# Altium footprint library PCB_PASSIVE.PcbLib: 100 footprints (part 5 of 7)
Each footprint in its own frame and in the unit in brackets; x right, y up, seen from the top. Pads: shape width x height; smd on the part's side, far side on the other; paste and mask are expansions set on the pad; w line width, h text height; cw(c..) or ccw(c..) is an arc to the next point about the centre after c.
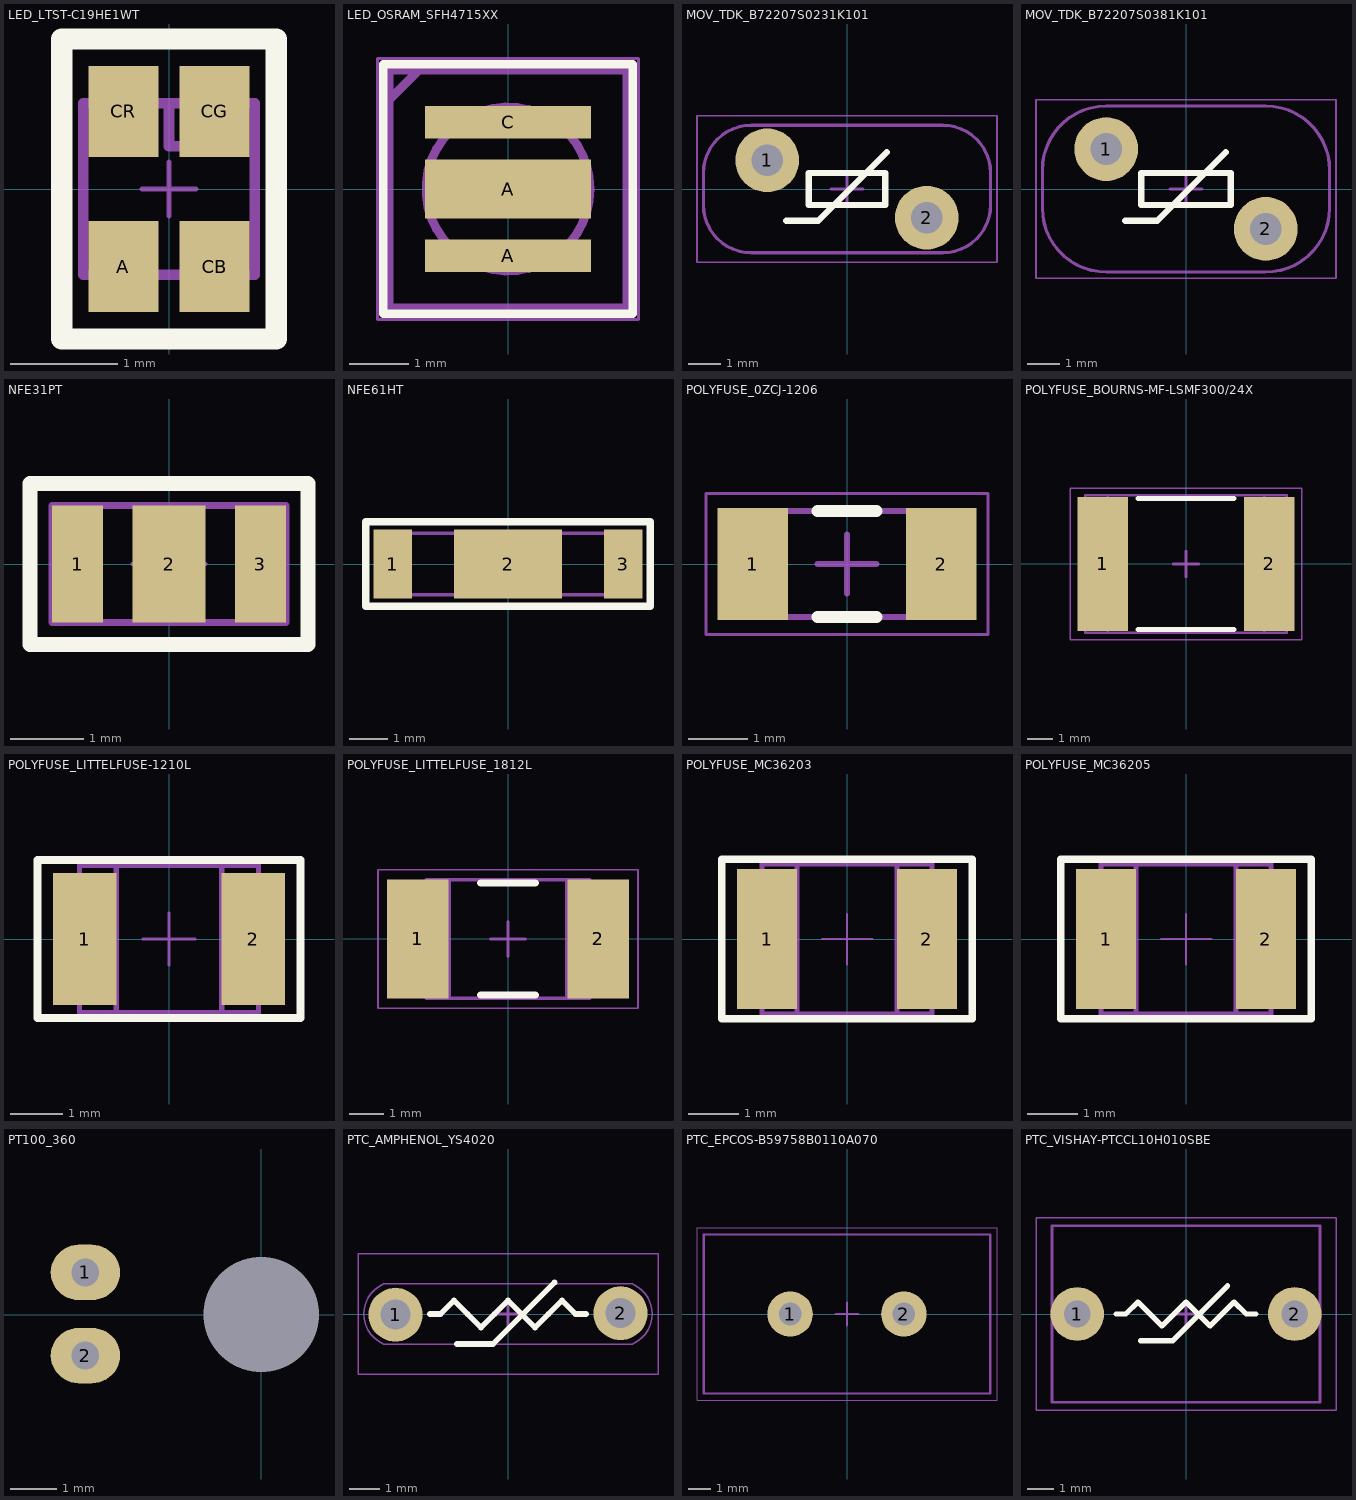
[diagram p4: the footprints below, top view; thin cyan lines are the x and y axes]

## LED_LTST-C19HE1WT [mm]
height 0.35
pads (4):
  rect 0.65x0.85 smd: A(-0.425,-0.725) CB(0.425,-0.725) CG(0.425,0.725) CR(-0.425,0.725)
Top Overlay:
  lines w0.2: -1,-1.4 -1,0 -1,1.4 1,1.4 1,-1.4 -1,-1.4
Mechanical 11:
  text ".Designator" at -1.4,-0.4 h1
Mechanical 14:
  lines w0.1: 0.4,0.8 0.4,0.4 0,0.4 0,0.8 ; 0,0.8 0.8,0.8 0.8,0 0.8,-0.8 0,-0.8 -0.8,-0.8 -0.8,0 -0.8,0.8 0,0.8
Mechanical 15:
  lines w0.05: -0.25,0 0.25,0 ; 0,-0.25 0,0.25 ; -1,-1.4 -1,0 -1,1.4 1,1.4 1,-1.4 -1,-1.4
3D body "User Library-HSMF-C114.STEP": height 0.34, standoff -0.01, extent -0.75,-0.8 0.75,0.8

## LED_OSRAM_SFH4715XX [mm] "IR Led"
height 0.6
pads (3):
  rect 2.8x0.55 smd mask+0.05: A(0,-1.125) C(0,1.125)
  rect 2.8x1 smd mask+0.05: A(0,0)
Top Overlay:
  lines w0.15: -2.1,-2.1 -2.1,2.1 2.1,2.1 2.1,-2.1 -2.1,-2.1
Mechanical 11:
  text ".Designator" at -1.4,0.8 h0.3
Mechanical 14:
  circle w0.15: c0,0 r1.38
  lines w0.15: -2,1.5 -1.5,2 ; -0.6,0.3 0.6,0.3 0,0.3 ; 0,0.3 0.6,-0.3 -0.6,-0.3 0,0.3 ; -2,-2 2,-2 2,2 -2,2 -2,-2
Mechanical 15:
  lines w0.05: -0.25,0 0.25,0 ; 0,-0.25 0,0.25 ; -2.2,-2.2 2.2,-2.2 2.2,2.2 -2.2,2.2 -2.2,-2.2

## MOV_TDK_B72207S0231K101 [mm]
height 11
pads (2):
  round 2 hole 1: 1(-2.5,0.9) 2(2.5,-0.9)
Top Overlay:
  lines w0.2: -1.9,-1 -0.9,-1 1.25,1.15 ; -1.2,-0.5 -1.2,0.5 1.2,0.5 1.2,-0.5 -1.2,-0.5
Mechanical 11:
  text ".Designator" at -3.35,-0.3 h1
Mechanical 14:
  circle w0.1: c-2.5,0.9 r0.3
  circle w0.1: c2.5,-0.9 r0.3
  lines w0.1: -4.5,-0.5 ccw(c-3,-0.5) -3,-2 0,-2 3,-2 ccw(c3,-0.5) 4.5,-0.5 4.5,0 4.5,0.5 ccw(c3,0.5) 3,2 0,2 -3,2 ccw(c-3,0.5) -4.5,0.5 -4.5,0 -4.5,-0.5
Mechanical 15:
  lines w0.05: -4.7,-2.3 -4.7,2.3 4.7,2.3 4.7,-2.3 -4.7,-2.3
  lines w0.1: -0.5,0 0.5,0 ; 0,-0.5 0,0.5
3D body "WE-VD_7_mm.stp": height 21.5, standoff -12.5, extent -4.497,-1.79 4.497,1.79

## MOV_TDK_B72207S0381K101 [mm]
height 12
pads (2):
  round 2 hole 1: 1(-2.5,1.25) 2(2.5,-1.25)
Top Overlay:
  lines w0.2: -1.9,-1 -0.9,-1 1.25,1.15 ; -1.4,-0.5 1.4,-0.5 1.4,0.5 -1.4,0.5 -1.4,-0.5
Mechanical 11:
  text ".Designator" at -3.35,-0.3 h1
Mechanical 14:
  lines w0.1: -2.5,2.6 ccw(c-2.5,0.6) -4.5,0.583 -4.5,-0.6 ccw(c-2.5,-0.6) -2.483,-2.6 2.483,-2.6 ccw(c2.5,-0.6) 4.5,-0.6 4.5,0.583 ccw(c2.5,0.6) 2.5,2.6 -2.483,2.6
Mechanical 15:
  lines w0.05: -4.7,-2.8 4.7,-2.8 4.7,2.8 -4.7,2.8 -4.7,-2.8
  lines w0.1: -0.5,0 0.5,0 ; 0,-0.5 0,0.5
3D body "WE-VD_7_mm.stp": height 21.5, standoff -12.5, extent -4.497,-1.79 4.497,1.79

## NFE31PT [mm]
pads (3):
  rect 0.7x1.6 smd: 1(-1.25,0) 3(1.25,0)
  rect 1x1.6 smd: 2(0,0)
Top Overlay:
  lines w0.2: -1.9,-1.1 -1.9,1.1 1.9,1.1 1.9,-1.1 -1.9,-1.1
Mechanical 11:
  text ".Designator" at -1.7,-0.3 h0.76
Mechanical 14:
  lines w0.1: -1.6,-0.8 1.6,-0.8 1.6,0.8 -1.6,0.8 -1.6,-0.8
Mechanical 15:
  lines w0.05: -0.5,0 0.5,0 ; 0,-0.5 0,0.5 ; -1.9,-1.1 1.9,-1.1 1.9,1.1 -1.9,1.1 -1.9,-1.1
3D body "User Library-Murata_NFE31P.STEP": height 1.6, standoff 0, extent -1.6,-0.8 1.6,0.8

## NFE61HT [mm]
pads (3):
  rect 1x1.8 smd: 1(-3,0) 3(3,0)
  rect 2.8x1.8 smd: 2(0,0)
Top Overlay:
  lines w0.2: -3.7,-1.1 -3.7,1.1 3.7,1.1 3.7,-1.1 -3.7,-1.1
Mechanical 11:
  text ".Designator" at -1.7,-0.3 h0.76
Mechanical 14:
  lines w0.1: -3.4,-0.8 3.4,-0.8 3.4,0.8 -3.4,0.8 -3.4,-0.8
Mechanical 15:
  lines w0.05: -0.5,0 0.5,0 ; 0,-0.5 0,0.5 ; -3.7,-1.1 3.7,-1.1 3.7,1.1 -3.7,1.1 -3.7,-1.1
3D body "User Library-LC2606.step": height 1.6, standoff 0, extent -3.4,-0.8 3.4,0.8

## POLYFUSE_0ZCJ-1206 [mm] "Chip Inductor, 2-Leads, Body 3,25x1,65mm, IPC Medium Density"
height 1.25
pads (2):
  rect 1.2x1.9 smd: 1(-1.6,0) 2(1.6,0)
Top Overlay:
  lines w0.2: -0.5,-0.9 0.5,-0.9 ; -0.5,0.9 0.5,0.9
Mechanical 11:
  text ".Designator" at -1,-0.2 h0.76
Mechanical 14:
  lines w0.1: -1.75,-0.9 -1.75,0.9 1.75,0.9 1.75,-0.9 -1.75,-0.9
Mechanical 15:
  lines w0.05: -2.4,-1.2 -2.4,1.2 2.4,1.2 2.4,-1.2 -2.4,-1.2
  lines w0.1: -0.5,0 0.5,0 ; 0,-0.5 0,0.5
3D body "INDC3217X12N.step": height 1.25, standoff 0, extent -1.75,-0.9 1.75,0.9

## POLYFUSE_BOURNS-MF-LSMF300/24X [mm]
height 1.6
pads (2):
  rect 2x5.3 smd: 1(-3.3,0) 2(3.3,0)
Top Overlay:
  lines w0.2: -1.9,-2.6 1.9,-2.6 ; -1.9,2.6 1.9,2.6
Mechanical 11:
  text ".Designator" at -2,-0.3 h1
Mechanical 14:
  lines w0.1: -3.1,-2.7 -3.1,2.72 ; 3.1,-2.72 3.1,2.7 ; -3.99,-2.72 3.99,-2.72 3.99,2.72 -3.99,2.72 -3.99,-2.72
Mechanical 15:
  lines w0.05: -4.6,-3 4.6,-3 4.6,3 -4.6,3 -4.6,-3
  lines w0.1: -0.5,0 0.5,0 ; 0,-0.5 0,0.5
3D body "INDC7451X16N.step": height 1.6, standoff 0, extent -3.99,-2.72 3.99,2.72

## POLYFUSE_LITTELFUSE-1210L [mm]
height 1.25
pads (2):
  rect 1.2x2.5 smd: 1(-1.6,0) 2(1.6,0)
Top Overlay:
  lines w0.15: -2.5,-1.5 -2.5,1.5 2.5,1.5 2.5,-1.5 -2.5,-1.5
Mechanical 11:
  text ".Designator" at -1.3,-0.3 h1
Mechanical 14:
  lines w0.1: -1,-1.4 -1,1.4 ; 1,-1.4 1,1.4 ; -1.7,-1.4 -1.7,1.4 1.7,1.4 1.7,-1.4 -1.7,-1.4
Mechanical 15:
  lines w0.05: -0.5,0 0.5,0 ; 0,-0.5 0,0.5 ; -2.5,-1.5 -2.5,1.5 2.5,1.5 2.5,-1.5 -2.5,-1.5
3D body "User Library-Fuse1210.step": height 0.67, standoff 0, extent -1.607,-1.287 1.608,1.288

## POLYFUSE_LITTELFUSE_1812L [mm]
height 1
pads (2):
  rect 1.78x3.44 smd: 1(-2.61,0) 2(2.61,0)
Top Overlay:
  lines w0.2: -0.8,-1.62 0.8,-1.62 ; -0.8,1.62 0.8,1.62
Mechanical 11:
  text ".Designator" at -0.65,-0.6 h1
Mechanical 14:
  lines w0.1: -1.7,-1.705 -1.7,1.705 ; 1.7,-1.705 1.7,1.705 ; -2.365,-1.705 2.365,-1.705 2.365,1.705 -2.365,1.705 -2.365,-1.705
Mechanical 15:
  lines w0.05: -3.75,-2 3.75,-2 3.75,2 -3.75,2 -3.75,-2
  lines w0.1: -0.5,0 0.5,0 ; 0,-0.5 0,0.5
3D body "SW3dPS-1812L.STEP": height 1.34, standoff 0, extent -2.365,-1.705 2.365,1.705

## POLYFUSE_MC36203 [mm]
height 1.25
pads (2):
  rect 1.2x2.8 smd: 1(-1.6,0) 2(1.6,0)
Top Overlay:
  lines w0.15: -2.5,-1.6 2.5,-1.6 2.5,1.6 -2.5,1.6 -2.5,-1.6
Mechanical 11:
  text ".Designator" at -1.3,-0.3 h1
Mechanical 14:
  lines w0.1: -1,-1.5 -1,1.5 ; 1,-1.5 1,1.5 ; -1.7,-1.5 1.7,-1.5 1.7,1.5 -1.7,1.5 -1.7,-1.5
Mechanical 15:
  lines w0.05: -0.5,0 0.5,0 ; 0,-0.5 0,0.5 ; -2.5,-1.6 2.5,-1.6 2.5,1.6 -2.5,1.6 -2.5,-1.6
3D body "User Library-Fuse1210.step": height 0.67, standoff 0, extent -1.607,-1.287 1.608,1.288

## POLYFUSE_MC36205 [mm]
height 1.25
pads (2):
  rect 1.2x2.8 smd: 1(-1.6,0) 2(1.6,0)
Top Overlay:
  lines w0.15: -2.5,-1.6 2.5,-1.6 2.5,1.6 -2.5,1.6 -2.5,-1.6
Mechanical 11:
  text ".Designator" at -1.3,-0.3 h1
Mechanical 14:
  lines w0.1: -1,-1.5 -1,1.5 ; 1,-1.5 1,1.5 ; -1.7,-1.5 1.7,-1.5 1.7,1.5 -1.7,1.5 -1.7,-1.5
Mechanical 15:
  lines w0.05: -0.5,0 0.5,0 ; 0,-0.5 0,0.5 ; -2.5,-1.6 2.5,-1.6 2.5,1.6 -2.5,1.6 -2.5,-1.6
3D body "User Library-Fuse1210.step": height 0.67, standoff 0, extent -1.607,-1.287 1.608,1.288

## PT100_360 [mm]
pads (5):
  oval 1.5x1.2 hole 0.6: 1(-3.81,0.911) 2(-3.81,-0.889)
  rect 0.254x0.254 on Mid2: 1S(-5.12,0.911) 2S(-5.12,-0.889)
  round 0 hole 2.5 unplated: P(0,0)

## PTC_AMPHENOL_YS4020 [mm]
height 10
pads (2):
  round 1.8 hole 1: 1(-3.75,-0.025) 2(3.75,0.025)
Top Overlay:
  lines w0.2: -2.6,0 -2.25,0 -1.8,0.45 -1.35,0 -0.9,-0.45 -0.45,0 0,0.45 0.45,0 0.9,-0.45 1.35,0 1.8,0.45 2.25,0 2.6,0 ; -1.7,-1 -0.5,-1 1.55,1.05
Mechanical 11:
  text ".Designator" at -3.3,-0.25 h1
Mechanical 14:
  lines w0.05: -4.15,-1 cw(c-3.706,0) -4.15,1 4.15,1 cw(c3.706,0) 4.15,-1 -4.15,-1
Mechanical 15:
  lines w0.05: -5,-2 -5,0 -5,2 0,2 5,2 5,0 5,-2 0,-2 -5,-2
  lines w0.1: -0.5,0 0.5,0 ; 0,-0.5 0,0.5
3D body "WE-VD_10_mm.stp": height 21.25, standoff -16.24, extent -6.544,-3.409 6.534,3.307

## PTC_EPCOS-B59758B0110A070 [mm]
height 16
pads (2):
  round 2 hole 1: 1(-2.5,0) 2(2.5,0)
Mechanical 11:
  text ".Designator" at -2.1,-0.25 h1
Mechanical 14:
  lines w0.1: -6.3,-3.5 6.3,-3.5 6.3,3.5 -6.3,3.5 -6.3,-3.5
Mechanical 15:
  lines w0.05: -6.6,-3.8 -6.6,3.8 6.6,3.8 6.6,-3.8 -6.6,-3.8
  lines w0.1: -0.5,0 0.5,0 ; 0,-0.5 0,0.5
3D body "WE-VD_10_mm.stp": height 21.25, standoff -16.25, extent -6.247,-2.107 6.247,2.108

## PTC_VISHAY-PTCCL10H010SBE [mm]
height 13.5
pads (2):
  round 2 hole 1: 1(-4.06,0) 2(4.06,0)
Top Overlay:
  lines w0.2: -2.6,0 -2.25,0 -1.8,0.45 -1.35,0 -0.9,-0.45 -0.45,0 0,0.45 0.45,0 0.9,-0.45 1.35,0 1.8,0.45 2.25,0 2.6,0 ; -1.7,-1 -0.5,-1 1.55,1.05
Mechanical 11:
  text ".Designator" at -2.1,-0.25 h1
Mechanical 14:
  lines w0.1: -5,-3.3 -5,3.3 5,3.3 5,-3.3 -5,-3.3
Mechanical 15:
  lines w0.05: -5.6,-3.6 5.6,-3.6 5.6,3.6 -5.6,3.6 -5.6,-3.6
  lines w0.1: -0.5,0 0.5,0 ; 0,-0.5 0,0.5
3D body "WE-VD_10_mm.stp": height 21.25, standoff -16.25, extent -6.247,-2.107 6.247,2.108